# Altium schematic symbol library IC_ADI.SCHLIB: 3169 symbols (part 138 of 181) (continued)
## AD9241ASZRL (continued)

## AD9243ASZ
designator U?
Single 14-Bit Monolithic Analog-to-Digital Converter with Parallel Interface, 3MSPS, -40 to +85 degC, S-44-1, Pb-Free, Tray; Generic Part Number: AD9243; PartNumber: AD9243ASZ; Resolution (Bits): 14; Channels: 1; Throughput Rate (SPS): 3M; Interface: Par; DatasheetVersion: Rev.A; PackageVersion: 041807-A; PackageReference: S-44-1; PackageDescription: 44-Lead Metric Quad Flat Package [MQFP]; Supplier Part Number 1: AD9243ASZ-ND; Supplier Part Number 2: 59K7226; Supplier Part Number 3: 584-AD9243ASZ; RoHS: Y; Packing: Tray; Mounting Technology: Surface Mount; Code_JEDEC: MS-022-AB-1; ComponentLink1Description: Manufacturer URL; ComponentLink2Description: Datasheet; ComponentLink3Description: Package Specification; ComponentLink4Description: Product URL
footprint LQFP44_0.8mm (Footprint not found)
pins: 1 DVSS (power) "Digital Ground", 2 AVSS (power) "Analog Ground", 3 DVDD (power) "+5 V Digital Supply", 4 AVDD (power) "+5 V Analog Supply", 5 DRVSS (power) "Digital Output Driver Ground", 6 DRVDD (power) "Digital Output Driver Supply", 7 CLK (in) "Clock Input Pin", 8 NC "No Connect", 9 NC "No Connect", 10 NC "No Connect", 11 BIT 14 (out) "Least Significant Data Bit (LSB)", 12 BIT 13 (out) "Data Output Bit", 13 BIT 12 (out) "Data Output Bit", 14 BIT 11 (out) "Data Output Bit", 15 BIT 10 (out) "Data Output Bit", 16 BIT 9 (out) "Data Output Bit", 17 BIT 8 (out) "Data Output Bit", 18 BIT 7 (out) "Data Output Bit", 19 BIT 6 (out) "Data Output Bit", 20 BIT 5 (out) "Data Output Bit", 21 BIT 4 (out) "Data Output Bit", 22 BIT 3 (out) "Data Output Bit", 23 BIT 2 (out) "Data Output Bit", 24 BIT 1 (out) "Most Significant Data Bit (MSB)", 25 OTR (out) "Out of Range", 26 NC "No Connect", 27 NC "No Connect", 28 AVDD (power) "+5 V Analog Supply", 29 AVSS (power) "Analog Ground", 30 NC "No Connect", 31 SENSE (in) "Reference Select", 32 VREF (io) "Reference I/O", 33 REFCOM (power) "Reference Common", 34 NC "No Connect", 35 NC "No Connect", 36 CAPB "Noise Reduction Pin", 37 CAPT "Noise Reduction Pin", 38 NC "No Connect", 39 CML (out) "Common-Mode Level (Midsupply)", 40 NC "No Connect", 41 VINA (in) "Analog Input Pin (+)", 42 VINB (in) "Analog Input Pin (-)", 43 NC "No Connect", 44 NC "No Connect"

## AD9243ASZRL
designator U?
Single 14-Bit Monolithic Analog-to-Digital Converter with Parallel Interface, 3MSPS, 0 to +70 degC, S-44-1, Pb-Free, Reel; Generic Part Number: AD9243; PartNumber: AD9243ASZRL; Resolution (Bits): 14; Channels: 1; Throughput Rate (SPS): 3M; Interface: Par; DatasheetVersion: Rev.A; PackageVersion: 041807-A; PackageReference: S-44-1; PackageDescription: 44-Lead Metric Quad Flat Package [MQFP]; Supplier Part Number 1: AD9243ASZRL-ND; Supplier Part Number 2: 584-AD9243ASZR; RoHS: Y; Packing: Reel; Mounting Technology: Surface Mount; Code_JEDEC: MS-022-AB-1; ComponentLink1Description: Manufacturer URL; ComponentLink2Description: Datasheet; ComponentLink3Description: Package Specification; ComponentLink4Description: Product URL
footprint LQFP44_0.8mm (Footprint not found)
pins: 1 DVSS (power) "Digital Ground", 2 AVSS (power) "Analog Ground", 3 DVDD (power) "+5 V Digital Supply", 4 AVDD (power) "+5 V Analog Supply", 5 DRVSS (power) "Digital Output Driver Ground", 6 DRVDD (power) "Digital Output Driver Supply", 7 CLK (in) "Clock Input Pin", 8 NC "No Connect", 9 NC "No Connect", 10 NC "No Connect", 11 BIT 14 (out) "Least Significant Data Bit (LSB)", 12 BIT 13 (out) "Data Output Bit", 13 BIT 12 (out) "Data Output Bit", 14 BIT 11 (out) "Data Output Bit", 15 BIT 10 (out) "Data Output Bit", 16 BIT 9 (out) "Data Output Bit", 17 BIT 8 (out) "Data Output Bit", 18 BIT 7 (out) "Data Output Bit", 19 BIT 6 (out) "Data Output Bit", 20 BIT 5 (out) "Data Output Bit", 21 BIT 4 (out) "Data Output Bit", 22 BIT 3 (out) "Data Output Bit", 23 BIT 2 (out) "Data Output Bit", 24 BIT 1 (out) "Most Significant Data Bit (MSB)", 25 OTR (out) "Out of Range", 26 NC "No Connect", 27 NC "No Connect", 28 AVDD (power) "+5 V Analog Supply", 29 AVSS (power) "Analog Ground", 30 NC "No Connect", 31 SENSE (in) "Reference Select", 32 VREF (io) "Reference I/O", 33 REFCOM (power) "Reference Common", 34 NC "No Connect", 35 NC "No Connect", 36 CAPB "Noise Reduction Pin", 37 CAPT "Noise Reduction Pin", 38 NC "No Connect", 39 CML (out) "Common-Mode Level (Midsupply)", 40 NC "No Connect", 41 VINA (in) "Analog Input Pin (+)", 42 VINB (in) "Analog Input Pin (-)", 43 NC "No Connect", 44 NC "No Connect"

## AD9244BSTZ-40
designator U?
Single 14-Bit Analog-to-Digital Converter with Parallel Interface, 40MSPS, -40 to +85 degC, ST-48, Pb-Free, Tray; Generic Part Number: AD9244-40; PartNumber: AD9244BSTZ-40; Resolution (Bits): 14; Channels: 1; Throughput Rate (SPS): 40M; Interface: Par; DatasheetVersion: Rev.C; PackageVersion: revA; PackageReference: ST-48; PackageDescription: 48-Pin Thin Quad Flat Pack 0.5 mm Pitch; Supplier Part Number 1: AD9244BSTZ-40-ND; Supplier Part Number 2: 59K7228; Supplier Part Number 3: 584-AD9244BSTZ-40; RoHS: Y; Packing: Tray; Mounting Technology: Surface Mount; ComponentLink1Description: Manufacturer URL; ComponentLink2Description: Datasheet; ComponentLink3Description: Package Specification; ComponentLink4Description: Product URL
footprint LQFP48_0.5MM (Footprint not found)
pins: 1 AGND (power) "Analog Ground.", 2 AGND (power) "Analog Ground.", 3 AVDD (power) "Analog Supply Voltage.", 4 AVDD (power) "Analog Supply Voltage.", 5 AGND (power) "Analog Ground.", 6 CLK- (in) "Differential Clock Inputs.", 7 CLK+ (in) "Differential Clock Inputs.", 8 NIC "No Internal Connection.", 9 OEB (in) "Digital Output Enable (Active Low).", 10 D0 (LSB) (hiz) "Least Significant Bit, Digital Output.", 11 D1 (hiz) "Digital Outputs.", 12 D2 (hiz) "Digital Outputs.", 13 D3 (hiz) "Digital Outputs.", 14 DGND (power) "Digital Ground.", 15 DRVDD (power) "Digital Supply Voltage.", 16 D4 (hiz) "Digital Outputs.", 17 D5 (hiz) "Digital Outputs.", 18 D6 (hiz) "Digital Outputs.", 19 D7 (hiz) "Digital Outputs.", 20 D8 (hiz) "Digital Outputs.", 21 D9 (hiz) "Digital Outputs.", 22 DGND (power) "Digital Ground.", 23 DRVDD (power) "Digital Supply Voltage.", 24 D10 (hiz) "Digital Outputs.", 25 D11 (hiz) "Digital Outputs.", 26 D12 (hiz) "Digital Outputs.", 27 D13 (MSB) (hiz) "Most Significant Bit, Digital Output.", 28 OTR (hiz) "Out-of-Range Indicator (Logic 1 Indicates OTR).", 29 DRVDD (power) "Digital Supply Voltage.", 30 DGND (power) "Digital Ground.", 31 AVDD (power) "Analog Supply Voltage.", 32 AGND (power) "Analog Ground.", 33 AGND (power) "Analog Ground.", 34 AVDD (power) "Analog Supply Voltage.", 35 DFS (in) "Data Format Select. Connect to AGND for straight binary, AVDD for twos complement.", 36 SENSE (in) "Internal Reference Control.", 37 VREF (io) "Internal Reference.", 38 REFGND (power) "Reference Ground.", 39 REFB "Internal Reference Decoupling.", 40 REFB "Internal Reference Decoupling.", 41 REFT "Internal Reference Decoupling.", 42 REFT "Internal Reference Decoupling.", 43 DCS (in) "50% Duty Cycle Stabilizer. Connect to AVDD to activate 50% duty cycle stabilizer, AGND for external control of both clock edges.", 44 NIC "No Internal Connection.", 45 CML (out) "Common-Mode Reference (0.5 x AVDD).", 46 VIN+ (in) "Differential Analog Inputs.", 47 VIN- (in) "Differential Analog Inputs.", 48 VR "Internal Bias Decoupling."

## AD9244BSTZ-65
designator U?
Single 14-Bit Analog-to-Digital Converter with Parallel Interface, 65MSPS, -40 to +85 degC, ST-48, Pb-Free, Tray; Generic Part Number: AD9244-65; PartNumber: AD9244BSTZ-65; Resolution (Bits): 14; Channels: 1; Throughput Rate (SPS): 65M; Interface: Par; DatasheetVersion: Rev.C; PackageVersion: revA; PackageReference: ST-48; PackageDescription: 48-Pin Thin Quad Flat Pack 0.5 mm Pitch; Supplier Part Number 1: AD9244BSTZ-65-ND; Supplier Part Number 2: 1581965; Supplier Part Number 3: 59K7229; Supplier Part Number 4: 584-AD9244BSTZ-65; RoHS: Y; Packing: Tray; Mounting Technology: Surface Mount; ComponentLink1Description: Manufacturer URL; ComponentLink2Description: Datasheet; ComponentLink3Description: Package Specification; ComponentLink4Description: Product URL
footprint LQFP48_0.5MM (Footprint not found)
pins: 1 AGND (power) "Analog Ground.", 2 AGND (power) "Analog Ground.", 3 AVDD (power) "Analog Supply Voltage.", 4 AVDD (power) "Analog Supply Voltage.", 5 AGND (power) "Analog Ground.", 6 CLK- (in) "Differential Clock Inputs.", 7 CLK+ (in) "Differential Clock Inputs.", 8 NIC "No Internal Connection.", 9 OEB (in) "Digital Output Enable (Active Low).", 10 D0 (LSB) (hiz) "Least Significant Bit, Digital Output.", 11 D1 (hiz) "Digital Outputs.", 12 D2 (hiz) "Digital Outputs.", 13 D3 (hiz) "Digital Outputs.", 14 DGND (power) "Digital Ground.", 15 DRVDD (power) "Digital Supply Voltage.", 16 D4 (hiz) "Digital Outputs.", 17 D5 (hiz) "Digital Outputs.", 18 D6 (hiz) "Digital Outputs.", 19 D7 (hiz) "Digital Outputs.", 20 D8 (hiz) "Digital Outputs.", 21 D9 (hiz) "Digital Outputs.", 22 DGND (power) "Digital Ground.", 23 DRVDD (power) "Digital Supply Voltage.", 24 D10 (hiz) "Digital Outputs.", 25 D11 (hiz) "Digital Outputs.", 26 D12 (hiz) "Digital Outputs.", 27 D13 (MSB) (hiz) "Most Significant Bit, Digital Output.", 28 OTR (out) "Out-of-Range Indicator (Logic 1 Indicates OTR).", 29 DRVDD (power) "Digital Supply Voltage.", 30 DGND (power) "Digital Ground.", 31 AVDD (power) "Analog Supply Voltage.", 32 AGND (power) "Analog Ground.", 33 AGND (power) "Analog Ground.", 34 AVDD (power) "Analog Supply Voltage.", 35 DFS (in) "Data Format Select. Connect to AGND for straight binary, AVDD for twos complement.", 36 SENSE (in) "Internal Reference Control.", 37 VREF (io) "Internal Reference.", 38 REFGND (power) "Reference Ground.", 39 REFB "Internal Reference Decoupling.", 40 REFB "Internal Reference Decoupling.", 41 REFT "Internal Reference Decoupling.", 42 REFT "Internal Reference Decoupling.", 43 DCS (in) "50% Duty Cycle Stabilizer. Connect to AVDD to activate 50% duty cycle stabilizer, AGND for external control of both clock edges.", 44 NIC "No Internal Connection.", 45 CML (out) "Common-Mode Reference (0.5 x AVDD).", 46 VIN+ (in) "Differential Analog Inputs.", 47 VIN- (in) "Differential Analog Inputs.", 48 VR "Internal Bias Decoupling."

## AD9244BSTZRL-40
designator U?
Single 14-Bit Analog-to-Digital Converter with Parallel Interface, 40MSPS, -40 to +85 degC, ST-48, Pb-Free, Reel; Generic Part Number: AD9244-40; PartNumber: AD9244BSTZRL-40; Resolution (Bits): 14; Channels: 1; Throughput Rate (SPS): 40M; Interface: Par; DatasheetVersion: Rev.C; PackageVersion: revA; PackageReference: ST-48; PackageDescription: 48-Pin Thin Quad Flat Pack 0.5 mm Pitch; Supplier Part Number 1: AD9244BSTZRL-40-ND; Supplier Part Number 2: 59K7230; Supplier Part Number 3: 584-AD9244BSTZR-40; RoHS: Y; Packing: Reel; Mounting Technology: Surface Mount; ComponentLink1Description: Manufacturer URL; ComponentLink2Description: Datasheet; ComponentLink3Description: Package Specification; ComponentLink4Description: Product URL
footprint LQFP48_0.5MM (Footprint not found)
pins: 1 AGND (power) "Analog Ground.", 2 AGND (power) "Analog Ground.", 3 AVDD (power) "Analog Supply Voltage.", 4 AVDD (power) "Analog Supply Voltage.", 5 AGND (power) "Analog Ground.", 6 CLK- (in) "Differential Clock Inputs.", 7 CLK+ (in) "Differential Clock Inputs.", 8 NIC "No Internal Connection.", 9 OEB (in) "Digital Output Enable (Active Low).", 10 D0 (LSB) (hiz) "Least Significant Bit, Digital Output.", 11 D1 (hiz) "Digital Outputs.", 12 D2 (hiz) "Digital Outputs.", 13 D3 (hiz) "Digital Outputs.", 14 DGND (power) "Digital Ground.", 15 DRVDD (power) "Digital Supply Voltage.", 16 D4 (hiz) "Digital Outputs.", 17 D5 (hiz) "Digital Outputs.", 18 D6 (hiz) "Digital Outputs.", 19 D7 (hiz) "Digital Outputs.", 20 D8 (hiz) "Digital Outputs.", 21 D9 (hiz) "Digital Outputs.", 22 DGND (power) "Digital Ground.", 23 DRVDD (power) "Digital Supply Voltage.", 24 D10 (hiz) "Digital Outputs.", 25 D11 (hiz) "Digital Outputs.", 26 D12 (hiz) "Digital Outputs.", 27 D13 (MSB) (hiz) "Most Significant Bit, Digital Output.", 28 OTR (hiz) "Out-of-Range Indicator (Logic 1 Indicates OTR).", 29 DRVDD (power) "Digital Supply Voltage.", 30 DGND (power) "Digital Ground.", 31 AVDD (power) "Analog Supply Voltage.", 32 AGND (power) "Analog Ground.", 33 AGND (power) "Analog Ground.", 34 AVDD (power) "Analog Supply Voltage.", 35 DFS (in) "Data Format Select. Connect to AGND for straight binary, AVDD for twos complement.", 36 SENSE (in) "Internal Reference Control.", 37 VREF (io) "Internal Reference.", 38 REFGND (power) "Reference Ground.", 39 REFB "Internal Reference Decoupling.", 40 REFB "Internal Reference Decoupling.", 41 REFT "Internal Reference Decoupling.", 42 REFT "Internal Reference Decoupling.", 43 DCS (in) "50% Duty Cycle Stabilizer. Connect to AVDD to activate 50% duty cycle stabilizer, AGND for external control of both clock edges.", 44 NIC "No Internal Connection.", 45 CML (out) "Common-Mode Reference (0.5 x AVDD).", 46 VIN+ (in) "Differential Analog Inputs.", 47 VIN- (in) "Differential Analog Inputs.", 48 VR "Internal Bias Decoupling."

## AD9244BSTZRL-65
designator U?
Single 14-Bit Analog-to-Digital Converter with Parallel Interface, 65MSPS, -40 to +85 degC, ST-48, Pb-Free, Reel; Generic Part Number: AD9244-65; PartNumber: AD9244BSTZRL-65; Resolution (Bits): 14; Channels: 1; Throughput Rate (SPS): 65M; Interface: Par; DatasheetVersion: Rev.C; PackageVersion: revA; PackageReference: ST-48; PackageDescription: 48-Pin Thin Quad Flat Pack 0.5 mm Pitch; Supplier Part Number 1: AD9244BSTZRL-65-ND; Supplier Part Number 2: 584-AD9244BSTZR-65; RoHS: Y; Packing: Reel; Mounting Technology: Surface Mount; ComponentLink1Description: Manufacturer URL; ComponentLink2Description: Datasheet; ComponentLink3Description: Package Specification; ComponentLink4Description: Product URL
footprint LQFP48_0.5MM (Footprint not found)
pins: 1 AGND (power) "Analog Ground.", 2 AGND (power) "Analog Ground.", 3 AVDD (power) "Analog Supply Voltage.", 4 AVDD (power) "Analog Supply Voltage.", 5 AGND (power) "Analog Ground.", 6 CLK- (in) "Differential Clock Inputs.", 7 CLK+ (in) "Differential Clock Inputs.", 8 NIC "No Internal Connection.", 9 OEB (in) "Digital Output Enable (Active Low).", 10 D0 (LSB) (hiz) "Least Significant Bit, Digital Output.", 11 D1 (hiz) "Digital Outputs.", 12 D2 (hiz) "Digital Outputs.", 13 D3 (hiz) "Digital Outputs.", 14 DGND (power) "Digital Ground.", 15 DRVDD (power) "Digital Supply Voltage.", 16 D4 (hiz) "Digital Outputs.", 17 D5 (hiz) "Digital Outputs.", 18 D6 (hiz) "Digital Outputs.", 19 D7 (hiz) "Digital Outputs.", 20 D8 (hiz) "Digital Outputs.", 21 D9 (hiz) "Digital Outputs.", 22 DGND (power) "Digital Ground.", 23 DRVDD (power) "Digital Supply Voltage.", 24 D10 (hiz) "Digital Outputs.", 25 D11 (hiz) "Digital Outputs.", 26 D12 (hiz) "Digital Outputs.", 27 D13 (MSB) (hiz) "Most Significant Bit, Digital Output.", 28 OTR (out) "Out-of-Range Indicator (Logic 1 Indicates OTR).", 29 DRVDD (power) "Digital Supply Voltage.", 30 DGND (power) "Digital Ground.", 31 AVDD (power) "Analog Supply Voltage.", 32 AGND (power) "Analog Ground.", 33 AGND (power) "Analog Ground.", 34 AVDD (power) "Analog Supply Voltage.", 35 DFS (in) "Data Format Select. Connect to AGND for straight binary, AVDD for twos complement.", 36 SENSE (in) "Internal Reference Control.", 37 VREF (io) "Internal Reference.", 38 REFGND (power) "Reference Ground.", 39 REFB "Internal Reference Decoupling.", 40 REFB "Internal Reference Decoupling.", 41 REFT "Internal Reference Decoupling.", 42 REFT "Internal Reference Decoupling.", 43 DCS (in) "50% Duty Cycle Stabilizer. Connect to AVDD to activate 50% duty cycle stabilizer, AGND for external control of both clock edges.", 44 NIC "No Internal Connection.", 45 CML (out) "Common-Mode Reference (0.5 x AVDD).", 46 VIN+ (in) "Differential Analog Inputs.", 47 VIN- (in) "Differential Analog Inputs.", 48 VR "Internal Bias Decoupling."

## AD9245BCPZ-20
designator U?
Single 14-Bit Analog-to-Digital Converter with Parallel Interface, 20MSPS, -40 to +85 degC, CP-32-2, Pb-Free, Tray; Generic Part Number: AD9245; PartNumber: AD9245BCPZ-20; Resolution (Bits): 14; Channels: 1; Throughput Rate (SPS): 80M; Interface: Par; DatasheetVersion: Rev.D; PackageVersion: Jan-2005; PackageReference: CP-32-2; PackageDescription: 32-Lead Lead Frame Chip Scale Package [LFCSP_VQ] 5 x 5 mm Body, Very Thin Quad; Supplier Part Number 1: AD9245BCPZ-20-ND; Supplier Part Number 2: 2305583; Supplier Part Number 3: 59K7232; Supplier Part Number 4: 584-AD9245BCPZ-20; RoHS: Y; Packing: Tray; Mounting Technology: Surface Mount; Code_JEDEC: MO-220-VHHD-2; ComponentLink1Description: Manufacturer URL; ComponentLink2Description: Datasheet; ComponentLink3Description: Package Specification; ComponentLink4Description: Product URL
footprint QFN32_0.5-PAD(5X5) (Footprint not found)
pins: 1 DNC "Do Not Connect", 2 CLK (in) "Clock Input Pin", 3 DNC "Do Not Connect", 4 PDWN (in) "Power-Down Function Select", 5 D0 (LSB) (hiz) "Data Output Bits", 6 D1 (hiz) "Data Output Bits", 7 D2 (hiz) "Data Output Bits", 8 D3 (hiz) "Data Output Bits", 9 D4 (hiz) "Data Output Bits", 10 D5 (hiz) "Data Output Bits", 11 D6 (hiz) "Data Output Bits", 12 D7 (hiz) "Data Output Bits", 13 D8 (hiz) "Data Output Bits", 14 D9 (hiz) "Data Output Bits", 15 DGND (power) "Digital Output Ground", 16 DRVDD (power) "Digital Output Driver Supply", 17 D10 (hiz) "Data Output Bits", 18 D11 (hiz) "Data Output Bits", 19 D12 (hiz) "Data Output Bits", 20 D13 (MSB) (hiz) "Data Output Bits", 21 OTR (out) "Out-of-Range Indicator", 22 MODE (in) "Data Format Select and DCS Mode Selection (See Table 11)", 23 SENSE (in) "Reference Mode Selection (See Table 10)", 24 VREF (io) "Voltage Reference Input/Output", 25 REFB "Differential Reference (-)", 26 REFT "Differential Reference (+)", 27 AVDD (power) "Analog Power Supply", 28 AGND (power) "Analog Ground", 29 VIN+ (in) "Analog Input Pin (+)", 30 VIN- (in) "Analog Input Pin (-)", 31 AGND (power) "Analog Ground", 32 AVDD (power) "Analog Power Supply", 33 EP (power) "Exposed Pad"

## AD9245BCPZ-40
designator U?
Single 14-Bit Analog-to-Digital Converter with Parallel Interface, 40MSPS, -40 to +85 degC, CP-32-2, Pb-Free, Tray; Generic Part Number: AD9245; PartNumber: AD9245BCPZ-40; Resolution (Bits): 14; Channels: 1; Throughput Rate (SPS): 80M; Interface: Par; DatasheetVersion: Rev.D; PackageVersion: Jan-2005; PackageReference: CP-32-2; PackageDescription: 32-Lead Lead Frame Chip Scale Package [LFCSP_VQ] 5 x 5 mm Body, Very Thin Quad; Supplier Part Number 1: AD9245BCPZ-40-ND; Supplier Part Number 2: 59K7233; Supplier Part Number 3: 584-AD9245BCPZ-40; RoHS: Y; Packing: Tray; Mounting Technology: Surface Mount; Code_JEDEC: MO-220-VHHD-2; ComponentLink1Description: Manufacturer URL; ComponentLink2Description: Datasheet; ComponentLink3Description: Package Specification; ComponentLink4Description: Product URL
footprint QFN32_0.5-PAD(5X5) (Footprint not found)
pins: 1 DNC "Do Not Connect", 2 CLK (in) "Clock Input Pin", 3 DNC "Do Not Connect", 4 PDWN (in) "Power-Down Function Select", 5 D0 (LSB) (hiz) "Data Output Bits", 6 D1 (hiz) "Data Output Bits", 7 D2 (hiz) "Data Output Bits", 8 D3 (hiz) "Data Output Bits", 9 D4 (hiz) "Data Output Bits", 10 D5 (hiz) "Data Output Bits", 11 D6 (hiz) "Data Output Bits", 12 D7 (hiz) "Data Output Bits", 13 D8 (hiz) "Data Output Bits", 14 D9 (hiz) "Data Output Bits", 15 DGND (power) "Digital Output Ground", 16 DRVDD (power) "Digital Output Driver Supply", 17 D10 (hiz) "Data Output Bits", 18 D11 (hiz) "Data Output Bits", 19 D12 (hiz) "Data Output Bits", 20 D13 (MSB) (hiz) "Data Output Bits", 21 OTR (out) "Out-of-Range Indicator", 22 MODE (in) "Data Format Select and DCS Mode Selection (See Table 11)", 23 SENSE (in) "Reference Mode Selection (See Table 10)", 24 VREF (io) "Voltage Reference Input/Output", 25 REFB "Differential Reference (-)", 26 REFT "Differential Reference (+)", 27 AVDD (power) "Analog Power Supply", 28 AGND (power) "Analog Ground", 29 VIN+ (in) "Analog Input Pin (+)", 30 VIN- (in) "Analog Input Pin (-)", 31 AGND (power) "Analog Ground", 32 AVDD (power) "Analog Power Supply", 33 EP (power) "Exposed Pad"

## AD9245BCPZ-65
designator U?
Single 14-Bit Analog-to-Digital Converter with Parallel Interface, 65MSPS, -40 to +85 degC, CP-32-2, Pb-Free, Tray; Generic Part Number: AD9245; PartNumber: AD9245BCPZ-65; Resolution (Bits): 14; Channels: 1; Throughput Rate (SPS): 80M; Interface: Par; DatasheetVersion: Rev.D; PackageVersion: Jan-2005; PackageReference: CP-32-2; PackageDescription: 32-Lead Lead Frame Chip Scale Package [LFCSP_VQ] 5 x 5 mm Body, Very Thin Quad; Supplier Part Number 1: AD9245BCPZ-65-ND; Supplier Part Number 2: 59K7234; Supplier Part Number 3: 584-AD9245BCPZ-65; RoHS: Y; Packing: Tray; Mounting Technology: Surface Mount; Code_JEDEC: MO-220-VHHD-2; ComponentLink1Description: Manufacturer URL; ComponentLink2Description: Datasheet; ComponentLink3Description: Package Specification; ComponentLink4Description: Product URL
footprint QFN32_0.5-PAD(5X5) (Footprint not found)
pins: 1 DNC "Do Not Connect", 2 CLK (in) "Clock Input Pin", 3 DNC "Do Not Connect", 4 PDWN (in) "Power-Down Function Select", 5 D0 (LSB) (hiz) "Data Output Bits", 6 D1 (hiz) "Data Output Bits", 7 D2 (hiz) "Data Output Bits", 8 D3 (hiz) "Data Output Bits", 9 D4 (hiz) "Data Output Bits", 10 D5 (hiz) "Data Output Bits", 11 D6 (hiz) "Data Output Bits", 12 D7 (hiz) "Data Output Bits", 13 D8 (hiz) "Data Output Bits", 14 D9 (hiz) "Data Output Bits", 15 DGND (power) "Digital Output Ground", 16 DRVDD (power) "Digital Output Driver Supply", 17 D10 (hiz) "Data Output Bits", 18 D11 (hiz) "Data Output Bits", 19 D12 (hiz) "Data Output Bits", 20 D13 (MSB) (hiz) "Data Output Bits", 21 OTR (out) "Out-of-Range Indicator", 22 MODE (in) "Data Format Select and DCS Mode Selection (See Table 11)", 23 SENSE (in) "Reference Mode Selection (See Table 10)", 24 VREF (io) "Voltage Reference Input/Output", 25 REFB "Differential Reference (-)", 26 REFT "Differential Reference (+)", 27 AVDD (power) "Analog Power Supply", 28 AGND (power) "Analog Ground", 29 VIN+ (in) "Analog Input Pin (+)", 30 VIN- (in) "Analog Input Pin (-)", 31 AGND (power) "Analog Ground", 32 AVDD (power) "Analog Power Supply", 33 EP (power) "Exposed Pad"

## AD9245BCPZ-80
designator U?
Single 14-Bit Analog-to-Digital Converter with Parallel Interface, 80MSPS, -40 to +85 degC, CP-32-2, Pb-Free, Tray; Generic Part Number: AD9245; PartNumber: AD9245BCPZ-80; Resolution (Bits): 14; Channels: 1; Throughput Rate (SPS): 80M; Interface: Par; DatasheetVersion: Rev.D; PackageVersion: Jan-2005; PackageReference: CP-32-2; PackageDescription: 32-Lead Lead Frame Chip Scale Package [LFCSP_VQ] 5 x 5 mm Body, Very Thin Quad; Supplier Part Number 1: AD9245BCPZ-80-ND; Supplier Part Number 2: 2096172; Supplier Part Number 3: 59K7235; Supplier Part Number 4: 584-AD9245BCPZ-80; RoHS: Y; Packing: Tray; Mounting Technology: Surface Mount; Code_JEDEC: MO-220-VHHD-2; ComponentLink1Description: Manufacturer URL; ComponentLink2Description: Datasheet; ComponentLink3Description: Package Specification; ComponentLink4Description: Product URL
footprint QFN32_0.5-PAD(5X5) (Footprint not found)
pins: 1 DNC "Do Not Connect", 2 CLK (in) "Clock Input Pin", 3 DNC "Do Not Connect", 4 PDWN (in) "Power-Down Function Select", 5 D0 (LSB) (hiz) "Data Output Bits", 6 D1 (hiz) "Data Output Bits", 7 D2 (hiz) "Data Output Bits", 8 D3 (hiz) "Data Output Bits", 9 D4 (hiz) "Data Output Bits", 10 D5 (hiz) "Data Output Bits", 11 D6 (hiz) "Data Output Bits", 12 D7 (hiz) "Data Output Bits", 13 D8 (hiz) "Data Output Bits", 14 D9 (hiz) "Data Output Bits", 15 DGND (power) "Digital Output Ground", 16 DRVDD (power) "Digital Output Driver Supply", 17 D10 (hiz) "Data Output Bits", 18 D11 (hiz) "Data Output Bits", 19 D12 (hiz) "Data Output Bits", 20 D13 (MSB) (hiz) "Data Output Bits", 21 OTR (out) "Out-of-Range Indicator", 22 MODE (in) "Data Format Select and DCS Mode Selection (See Table 11)", 23 SENSE (in) "Reference Mode Selection (See Table 10)", 24 VREF (io) "Voltage Reference Input/Output", 25 REFB "Differential Reference (-)", 26 REFT "Differential Reference (+)", 27 AVDD (power) "Analog Power Supply", 28 AGND (power) "Analog Ground", 29 VIN+ (in) "Analog Input Pin (+)", 30 VIN- (in) "Analog Input Pin (-)", 31 AGND (power) "Analog Ground", 32 AVDD (power) "Analog Power Supply", 33 EP (power) "Exposed Pad"

## AD9246BCPZ-80
designator U?
Single 14-Bit Analog-to-Digital Converter with Parallel Interface, 1.8 V, 80MSPS, -40 to +85 degC, CP-48-3, Pb-Free, Tray; Generic Part Number: AD9246-80; PartNumber: AD9246BCPZ-80; Resolution (Bits): 14; Channels: 1; Throughput Rate (SPS): 80M; Interface: Par; DatasheetVersion: Rev.A; PackageVersion: 2005; PackageReference: CP-48-3; PackageDescription: 48-Lead Lead Frame Chip Scale Package [LFCSP_VQ] 7 x 7 mm Body, Very Thin Quad; Supplier Part Number 1: AD9246BCPZ-80-ND; Supplier Part Number 2: 584-AD9246BCPZ-80; RoHS: Y; Packing: Tray; Mounting Technology: Surface Mount; Code_JEDEC: MO-220-VKKD-2; ComponentLink1Description: Manufacturer URL; ComponentLink2Description: Datasheet; ComponentLink3Description: Package Specification; ComponentLink4Description: Product URL
footprint QFN48_0.5-PAD(7X7) (Footprint not found)
pins: 1 D2 (hiz) "Data Output Bits.", 2 D3 (hiz) "Data Output Bits.", 3 D4 (hiz) "Data Output Bits.", 4 D5 (hiz) "Data Output Bits.", 5 D6 (hiz) "Data Output Bits.", 6 D7 (hiz) "Data Output Bits.", 7 DRGND (power) "Digital Output Ground.", 8 DRVDD (power) "Digital Output Driver Supply (1.8 V to 3.3 V).", 9 D8 (hiz) "Data Output Bits.", 10 D9 (hiz) "Data Output Bits.", 11 D10 (hiz) "Data Output Bits.", 12 D11 (hiz) "Data Output Bits.", 13 D12 (hiz) "Data Output Bits.", 14 D13 (MSB) (hiz) "Data Output Bits.", 15 OR (hiz) "Out-of-Range Indicator.", 16 DRGND (power) "Digital Output Ground.", 17 DRVDD (power) "Digital Output Driver Supply (1.8 V to 3.3 V).", 18 SDIO/DCS (io) "Serial Port Interface (SPI)?Data Input/Output (Serial Port Mode); Duty Cycle Stabilizer Select (External Pin Mode). See Table 10.", 19 SCLK/DFS (in) "Serial Port Interface Clock (Serial Port Mode); Data Format Select Pin (External Pin Mode).", 20 CSB (in) "Serial Port Interface Chip Select (Active Low). See Table 10.", 21 AGND (power) "Analog Ground.", 22 AVDD (power) "Analog Power Supply.", 23 AGND (power) "Analog Ground.", 24 AVDD (power) "Analog Power Supply.", 25 SENSE (in) "Reference Mode Selection. See Table 9.", 26 VREF (io) "Voltage Reference Input/Output.", 27 REFB "Differential Reference (-).", 28 REFT "Differential Reference (+).", 29 AGND (power) "Analog Ground.", 30 VIN+ (in) "Analog Input Pin (+).", 31 VIN- (in) "Analog Input Pin (-).", 32 AGND (power) "Analog Ground.", 33 AVDD (power) "Analog Power Supply.", 34 CML (out) "Common-Mode Level Bias Output.", 35 RBIAS (in) "External Bias Resistor Connection. A 10 kO resistor must be connected between this pin and analog ground (AGND).", 36 PDWN (in) "Power-Down Function Select.", 37 AGND (power) "Analog Ground.", 38 CLK+ (in) "Clock Input (+).", 39 CLK- (in) "Clock Input (-).", 40 AVDD (power) "Analog Power Supply.", 41 AGND (power) "Analog Ground.", 42 AVDD (power) "Analog Power Supply.", 43 OEB (in) "Output Enable (Active Low).", 44 DCO (hiz) "Data Clock Output.", 45 D0 (LSB) (hiz) "Data Output Bits.", 46 D1 (hiz) "Data Output Bits.", 47 DRGND (power) "Digital Output Ground.", 48 DRVDD (power) "Digital Output Driver Supply (1.8 V to 3.3 V).", 49 EP (power) "Analog Ground."

## AD9246BCPZ-105
designator U?
Single 14-Bit Analog-to-Digital Converter with Parallel Interface, 1.8 V, 105MSPS, -40 to +85 degC, CP-48-3, Pb-Free, Tray; Generic Part Number: AD9246-105; PartNumber: AD9246BCPZ-105; Resolution (Bits): 14; Channels: 1; Throughput Rate (SPS): 105M; Interface: Par; DatasheetVersion: Rev.A; PackageVersion: 2005; PackageReference: CP-48-3; PackageDescription: 48-Lead Lead Frame Chip Scale Package [LFCSP_VQ] 7 x 7 mm Body, Very Thin Quad; Supplier Part Number 1: AD9246BCPZ-105-ND; Supplier Part Number 2: 19M1207; Supplier Part Number 3: 584-AD9246BCPZ-105; RoHS: Y; Packing: Tray; Mounting Technology: Surface Mount; Code_JEDEC: MO-220-VKKD-2; ComponentLink1Description: Manufacturer URL; ComponentLink2Description: Datasheet; ComponentLink3Description: Package Specification; ComponentLink4Description: Product URL
footprint QFN48_0.5-PAD(7X7) (Footprint not found)
part A pins: 1 D2 (hiz) "Data Output Bits.", 2 D3 (hiz) "Data Output Bits.", 3 D4 (hiz) "Data Output Bits.", 4 D5 (hiz) "Data Output Bits.", 5 D6 (hiz) "Data Output Bits.", 6 D7 (hiz) "Data Output Bits.", 9 D8 (hiz) "Data Output Bits.", 10 D9 (hiz) "Data Output Bits.", 11 D10 (hiz) "Data Output Bits.", 12 D11 (hiz) "Data Output Bits.", 13 D12 (hiz) "Data Output Bits.", 14 D13 (MSB) (hiz) "Data Output Bits.", 15 OR (hiz) "Out-of-Range Indicator.", 18 SDIO/DCS (io) "Serial Port Interface (SPI)?Data Input/Output (Serial Port Mode); Duty Cycle Stabilizer Select (External Pin Mode). See Table 10.", 19 SCLK/DFS (in) "Serial Port Interface Clock (Serial Port Mode); Data Format Select Pin (External Pin Mode).", 20 CSB (in) "Serial Port Interface Chip Select (Active Low). See Table 10.", 25 SENSE (in) "Reference Mode Selection. See Table 9.", 26 VREF (io) "Voltage Reference Input/Output.", 27 REFB "Differential Reference (-).", 28 REFT "Differential Reference (+).", 30 VIN+ (in) "Analog Input Pin (+).", 31 VIN- (in) "Analog Input Pin (-).", 34 CML (out) "Common-Mode Level Bias Output.", 35 RBIAS (in) "External Bias Resistor Connection. A 10 kO resistor must be connected between this pin and analog ground (AGND).", 36 PDWN (in) "Power-Down Function Select.", 38 CLK+ (in) "Clock Input (+).", 39 CLK- (in) "Clock Input (-).", 43 OEB (in) "Output Enable (Active Low).", 44 DCO (hiz) "Data Clock Output.", 45 D0 (LSB) (hiz) "Data Output Bits.", 46 D1 (hiz) "Data Output Bits."
part B pins: 7 DRGND (power) "Digital Output Ground.", 8 DRVDD (power) "Digital Output Driver Supply (1.8 V to 3.3 V).", 16 DRGND (power) "Digital Output Ground.", 17 DRVDD (power) "Digital Output Driver Supply (1.8 V to 3.3 V).", 21 AGND (power) "Analog Ground.", 22 AVDD (power) "Analog Power Supply.", 23 AGND (power) "Analog Ground.", 24 AVDD (power) "Analog Power Supply.", 29 AGND (power) "Analog Ground.", 32 AGND (power) "Analog Ground.", 33 AVDD (power) "Analog Power Supply.", 37 AGND (power) "Analog Ground.", 40 AVDD (power) "Analog Power Supply.", 41 AGND (power) "Analog Ground.", 42 AVDD (power) "Analog Power Supply.", 47 DRGND (power) "Digital Output Ground.", 48 DRVDD (power) "Digital Output Driver Supply (1.8 V to 3.3 V).", 49 EP (power) "Analog Ground."

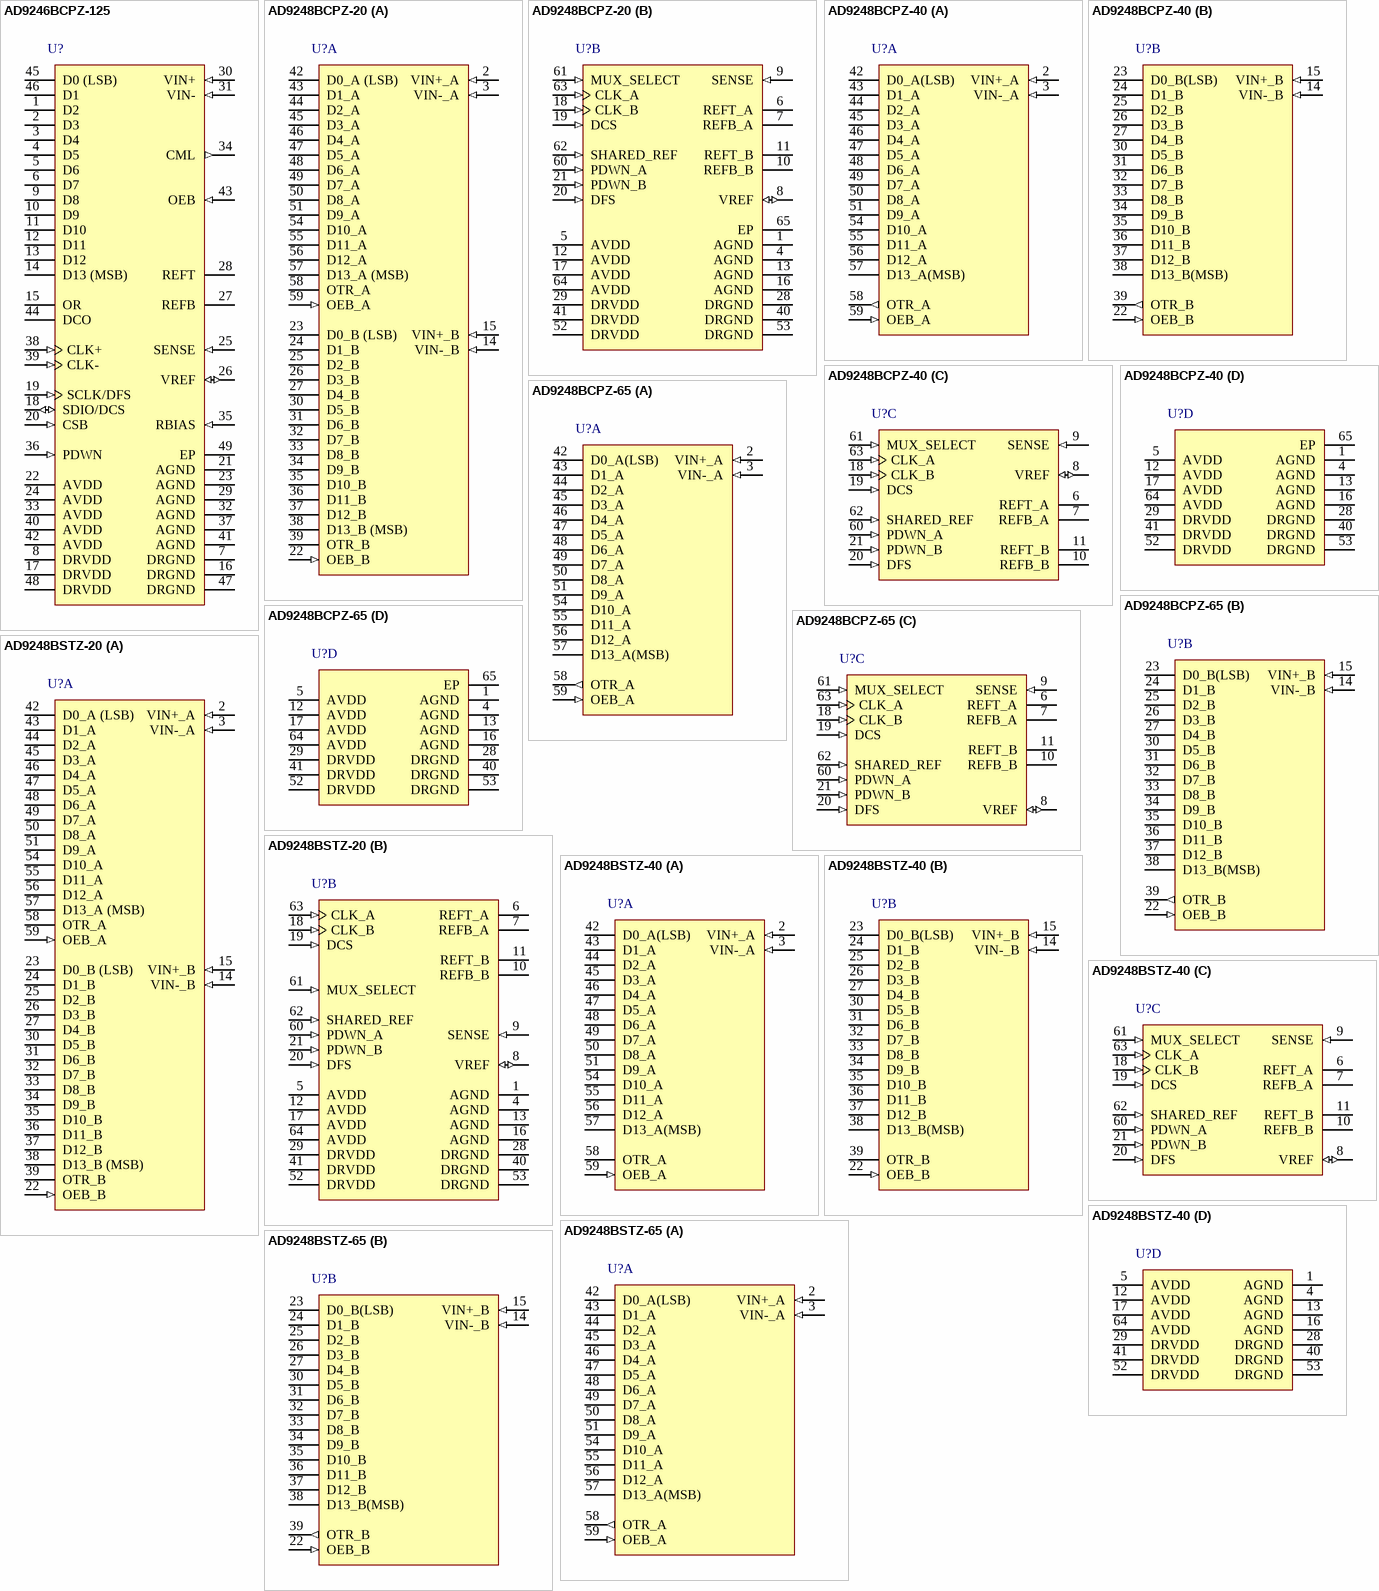
[diagram p115: symbols AD9246BCPZ-125 to AD9248BSTZ-65]

## AD9246BCPZ-125
designator U?
Single 14-Bit Analog-to-Digital Converter with Parallel Interface, 1.8 V, 125MSPS, -40 to +85 degC, CP-48-3, Pb-Free, Tray; Generic Part Number: AD9246-125; PartNumber: AD9246BCPZ-125; Resolution (Bits): 14; Channels: 1; Throughput Rate (SPS): 125M; Interface: Par; DatasheetVersion: Rev.A; PackageVersion: 2005; PackageReference: CP-48-3; PackageDescription: 48-Lead Lead Frame Chip Scale Package [LFCSP_VQ] 7 x 7 mm Body, Very Thin Quad; Supplier Part Number 1: AD9246BCPZ-125-ND; Supplier Part Number 2: 19M1208; RoHS: Y; Packing: Tray; Mounting Technology: Surface Mount; Code_JEDEC: MO-220-VKKD-2; ComponentLink1Description: Manufacturer URL; ComponentLink2Description: Datasheet; ComponentLink3Description: Package Specification; ComponentLink4Description: Product URL
footprint QFN48_0.5-PAD(7X7) (Footprint not found)
pins: 1 D2 (hiz) "Data Output Bits.", 2 D3 (hiz) "Data Output Bits.", 3 D4 (hiz) "Data Output Bits.", 4 D5 (hiz) "Data Output Bits.", 5 D6 (hiz) "Data Output Bits.", 6 D7 (hiz) "Data Output Bits.", 7 DRGND (power) "Digital Output Ground.", 8 DRVDD (power) "Digital Output Driver Supply (1.8 V to 3.3 V).", 9 D8 (hiz) "Data Output Bits.", 10 D9 (hiz) "Data Output Bits.", 11 D10 (hiz) "Data Output Bits.", 12 D11 (hiz) "Data Output Bits.", 13 D12 (hiz) "Data Output Bits.", 14 D13 (MSB) (hiz) "Data Output Bits.", 15 OR (hiz) "Out-of-Range Indicator.", 16 DRGND (power) "Digital Output Ground.", 17 DRVDD (power) "Digital Output Driver Supply (1.8 V to 3.3 V).", 18 SDIO/DCS (io) "Serial Port Interface (SPI)?Data Input/Output (Serial Port Mode); Duty Cycle Stabilizer Select (External Pin Mode). See Table 10.", 19 SCLK/DFS (in) "Serial Port Interface Clock (Serial Port Mode); Data Format Select Pin (External Pin Mode).", 20 CSB (in) "Serial Port Interface Chip Select (Active Low). See Table 10.", 21 AGND (power) "Analog Ground.", 22 AVDD (power) "Analog Power Supply.", 23 AGND (power) "Analog Ground.", 24 AVDD (power) "Analog Power Supply.", 25 SENSE (in) "Reference Mode Selection. See Table 9.", 26 VREF (io) "Voltage Reference Input/Output.", 27 REFB "Differential Reference(-).", 28 REFT "Differential Reference (+).", 29 AGND (power) "Analog Ground.", 30 VIN+ (in) "Analog Input Pin (+).", 31 VIN- (in) "Analog Input Pin (-).", 32 AGND (power) "Analog Ground.", 33 AVDD (power) "Analog Power Supply.", 34 CML (out) "Common-Mode Level Bias Output.", 35 RBIAS (in) "External Bias Resistor Connection. A 10 k ohm resistor must be connected between this pin and analog ground (AGND).", 36 PDWN (in) "Power-Down Function Select.", 37 AGND (power) "Analog Ground.", 38 CLK+ (in) "Clock Input (+).", 39 CLK- (in) "Clock Input (-).", 40 AVDD (power) "Analog Power Supply.", 41 AGND (power) "Analog Ground.", 42 AVDD (power) "Analog Power Supply.", 43 OEB (in) "Output Enable (Active Low).", 44 DCO (hiz) "Data Clock Output.", 45 D0 (LSB) (hiz) "Data Output Bits.", 46 D1 (hiz) "Data Output Bits.", 47 DRGND (power) "Digital Output Ground.", 48 DRVDD (power) "Digital Output Driver Supply (1.8 V to 3.3 V).", 49 EP (power) "Analog Ground."